# Altium footprint library pcb2D3D库101.PcbLib: 411 footprints (part 3 of 26)
Each footprint in its own frame and in the unit in brackets; x right, y up, seen from the top. Pads: shape width x height; smd on the part's side, far side on the other; paste and mask are expansions set on the pad; w line width, h text height; cw(c..) or ccw(c..) is an arc to the next point about the centre after c.
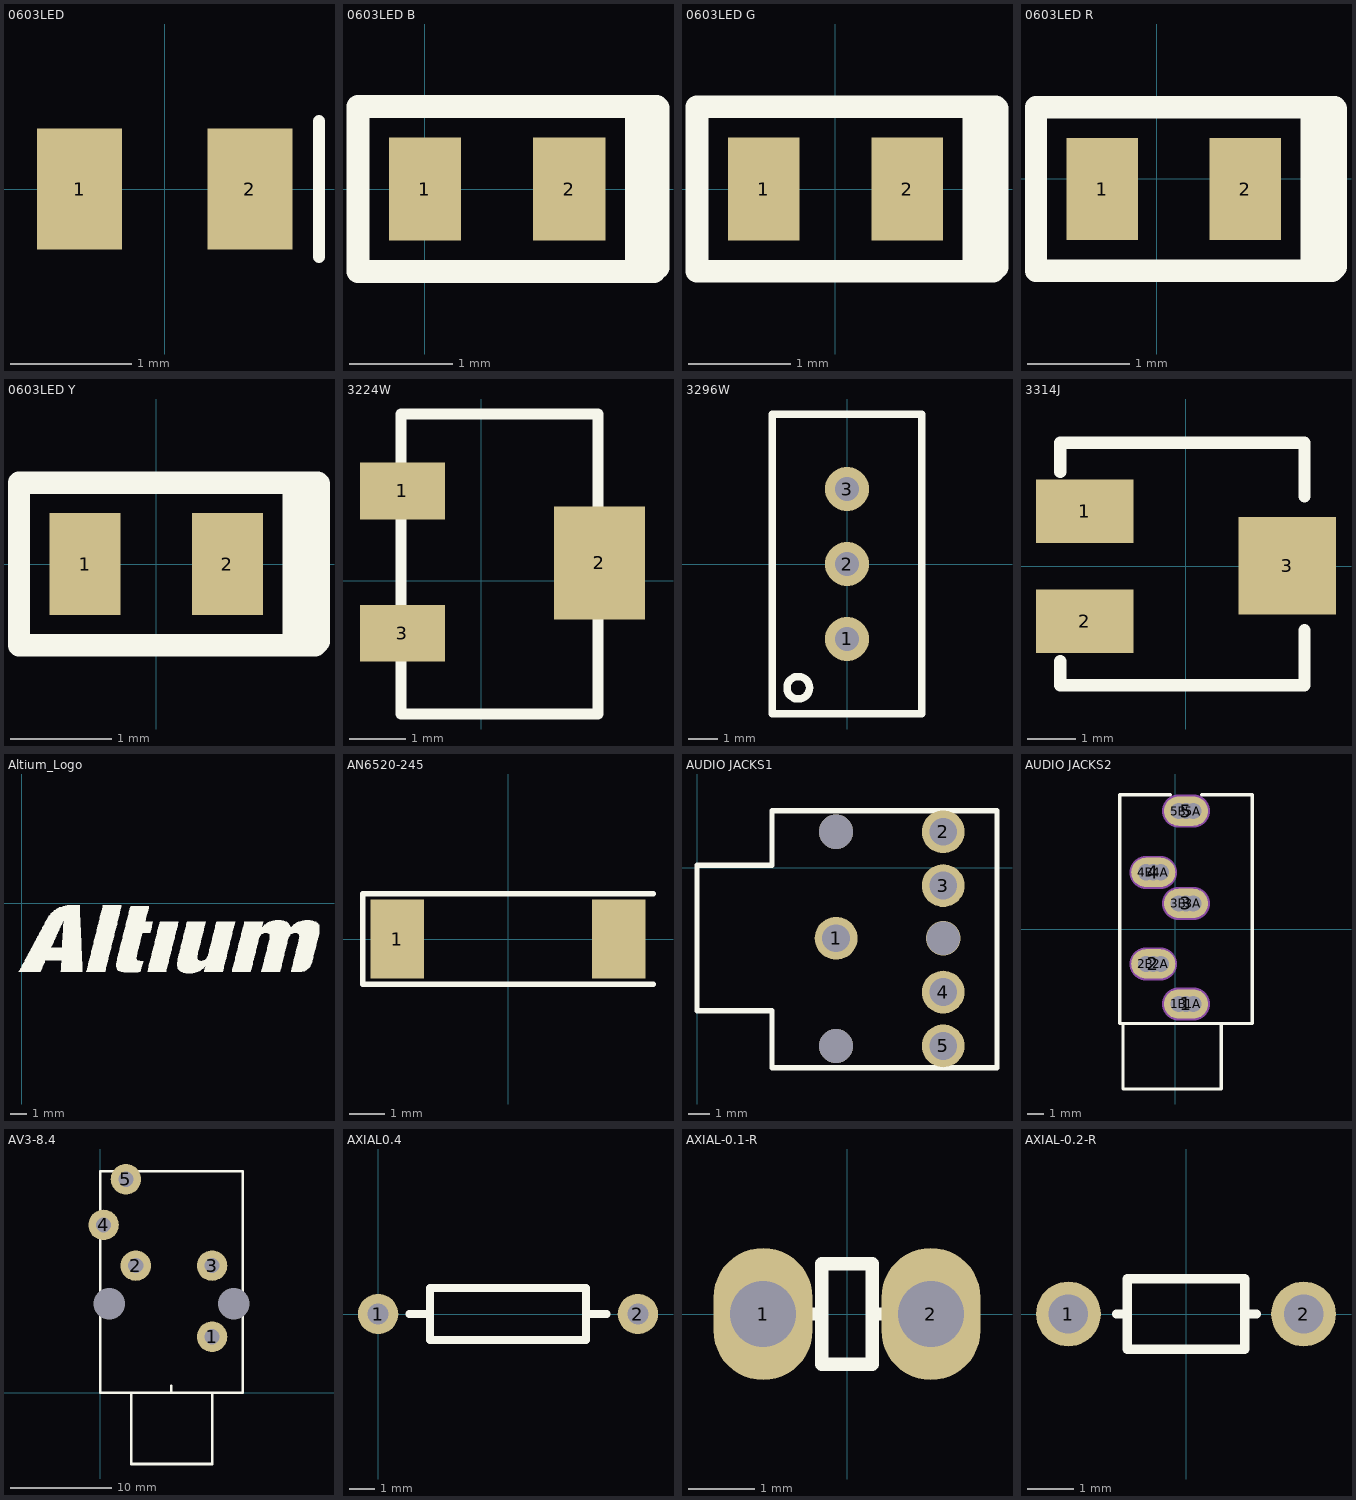
[diagram p2: the footprints below, top view; thin cyan lines are the x and y axes]

## 0603LED [mm]
pads (2):
  rect 0.7x1 smd: 1(-0.7,0) 2(0.7,0)
TopOverlay:
  lines w0.1: 1.27,-0.559 1.27,0.559
3D body "User Library-led_0603LED0603 orange.STEP": height 0.6, standoff 0, extent -0.81,-0.4 0.81,0.4

## 0603LED B [mm]
pads (2):
  rect 0.7x1 smd: 1(0,0) 2(1.4,0)
TopOverlay:
  lines w0.22: 2.248,0.8 2.05,0.8 ; 2.261,0.787 2.261,-0.762 2.223,-0.8 2.05,-0.8 ; 2.05,-0.8 -0.65,-0.8 -0.65,0.8 2.05,0.8 ; 2.05,-0.8 2.05,0.8 ; 2.083,-0.457 2.083,0.66 2.083,-0.457
3D body "User Library-led_0603LED0603 blue.STEP": height 0.6, standoff 0, extent -0.099,-0.4 1.521,0.4

## 0603LED G [mm]
pads (2):
  rect 0.7x1 smd: 1(-0.7,0) 2(0.7,0)
TopOverlay:
  lines w0.22: 1.562,0.8 1.364,0.8 1.364,-0.8 1.537,-0.8 1.575,-0.762 1.575,0.787 ; -1.35,-0.8 1.35,-0.8 1.35,0.8 -1.35,0.8 -1.35,-0.8 ; 1.397,-0.457 1.397,0.66 1.397,-0.457
3D body "User Library-led_0603LED0603 green.STEP": height 0.6, standoff 0, extent -0.81,-0.4 0.81,0.4

## 0603LED R [mm]
pads (2):
  rect 0.7x1 smd: 1(-0.533,-0.102) 2(0.867,-0.102)
TopOverlay:
  lines w0.22: 1.528,-0.902 1.528,0.698 ; 1.74,0.698 1.542,0.698 1.542,-0.902 1.715,-0.902 1.753,-0.864 1.753,0.686 ; -1.183,-0.902 -1.183,0.698 1.517,0.698 1.517,-0.902 -1.183,-0.902 ; 1.575,-0.559 1.575,0.559 1.575,-0.559
3D body "User Library-led_0603.STEP": height 0.6, standoff 0, extent -0.632,-0.501 0.988,0.299

## 0603LED Y [mm]
pads (2):
  rect 0.7x1 smd: 1(-0.7,0) 2(0.7,0)
TopOverlay:
  lines w0.22: 1.364,-0.8 1.364,0.8 ; 1.375,-0.8 1.375,0.8 ; 1.588,0.8 1.39,0.8 1.39,-0.8 1.562,-0.8 1.6,-0.762 1.6,0.787 ; -1.35,-0.8 1.35,-0.8 1.35,0.8 -1.35,0.8 -1.35,-0.8 ; 1.422,-0.457 1.422,0.66 1.422,-0.457
3D body "User Library-led_0603LED0603 orange.STEP": height 0.6, standoff 0, extent -0.81,-0.4 0.81,0.4

## 3224W [mm]
pads (3):
  rect 1.5x1 smd: 1(-1.397,1.583) 3(-1.397,-0.932)
  rect 1.6x2 smd: 2(2.083,0.313)
TopOverlay:
  lines w0.2: -1.422,-2.354 -1.422,2.942 2.057,2.942 2.057,-2.354 -1.422,-2.354
Mechanical2:
  text "+" at -0.203,0.63 h0.76
3D body "3224W.stp": height 5.29, standoff 0, extent -1.627,-2.134 2.311,2.692

## 3296W [mm]
height 2.38
pads (3):
  round 1.5 hole 0.8: 1(0,-2.54) 2(0,0) 3(0,2.54)
TopOverlay:
  circle w0.254: c-1.651,-4.191 r0.381
  lines w0.254: -2.54,-5.08 2.54,-5.08 2.54,5.08 -2.54,5.08 -2.54,-5.08
3D body "3296 pot.step": height 11.55, standoff -6.4, extent -2.413,-4.765 2.418,4.765

## 3314J [mm]
pads (3):
  rect 2x1.3 smd: 1(-2.072,1.124) 2(-2.072,-1.124)
  rect 2x2 smd: 3(2.072,0.007)
TopOverlay:
  lines w0.254: -2.578,-1.95 -2.578,-2.436 2.427,-2.436 2.427,-1.31 ; -2.578,1.93 -2.578,2.528 2.427,2.528 2.427,1.429
3D body "3314J.stp": height 2.67, standoff -0.06, extent -2.54,-2.423 2.464,2.576

## Altium_Logo [mm]
TopOverlay:
  drawing of 1243 lines, arcs and shapes, not listed

## AN6520-245 [mm]
height 1.2
pads (2):
  rect 1.5x2.2 smd: 1(-3.1,0) ""(3.1,0)
TopOverlay:
  lines w0.152: 4.064,-1.27 -4.064,-1.27 -4.064,1.27 4.064,1.27
3D body "AN6520-245.STEP": height 1.2, standoff 0, extent -3.25,-1.092 3.25,1.108

## AUDIO JACKS1 [mm]
pads (5):
  round 2 hole 1.3: 1(6.502,-3.302) 2(11.506,1.676) 3(11.506,-0.838) 4(11.506,-5.817) 5(11.506,-8.331)
via 11.506,-3.302 diameter 1.6 hole 1.56
via 6.502,-8.331 diameter 1.6 hole 1.6
via 6.502,1.676 diameter 1.6 hole 1.6
TopOverlay:
  lines w0.254: 0,-6.68 0,0.102 3.505,0.102 3.505,2.667 14.021,2.667 14.021,-9.347 3.505,-9.347 3.505,-6.68 0,-6.68
3D body "sj1-3545n(AUDIO JACKS).stp": height 11.1, standoff -3.9, extent 0.011,-9.377 15.011,2.823

## AUDIO JACKS2 [mm]
pads (15):
  oval 2.7x1.8 hole 1: 1(0.672,-4.579) 2(-1.328,-2.129) 3(0.672,1.571) 4(-1.328,3.471) 5(0.672,7.221)
  round 1.2 hole 1: 1A(1.122,-4.579) 1B(0.222,-4.579) 2A(-0.878,-2.129) 2B(-1.778,-2.129) 3A(1.122,1.571) 3B(0.222,1.571) 4A(-0.878,3.471) 4B(-1.778,3.471) 5A(1.122,7.221) 5B(0.222,7.221)
TopOverlay:
  lines w0.2: -3.178,-5.779 -3.178,-9.779 2.822,-9.779 2.822,-5.779 ; -0.278,8.221 -3.378,8.221 -3.378,-5.779 4.722,-5.779 4.722,8.221 1.622,8.221
Mechanical2:
  lines w2.016: -1.778,-2.129 -0.878,-2.129 ; -1.778,3.471 -0.878,3.471 ; 0.222,-4.579 1.122,-4.579 ; 0.222,1.571 1.122,1.571 ; 0.222,7.221 1.122,7.221
3D body "AUDIO JACK.stp": height 5.3, standoff -10.3, extent -3.478,-9.779 4.722,8.221

## AV3-8.4 [mm]
pads (7):
  round 3 hole 1.5: 1(11,5.5) 2(3.5,12.5) 3(11,12.5) 4(0.325,16.5) 5(2.525,21)
  round 3 hole 3.1 unplated: ""(0.9,8.75) ""(13.15,8.75)
TopOverlay:
  lines w0.254: 3.04,0 3.04,-7.02 11.02,-7.02 11.02,0 ; 7,0 7,0.66 ; 0,0 14,0 14,21.8 0,21.8 0,0
3D body "User Library-Mouser_161-4320.STEP": height 40.92, standoff -4.32, extent 0.3,-8.208 17.115,23.008

## AXIAL0.4 [mil] "此模型引用\"王千会\"作品，特此声明"
height 47.24
pads (2):
  round 62 hole 32: 1(0,0) 2(400,0)
TopOverlay:
  lines w12: 48,0 80,0 ; 320,0 352,0 ; 80,-40 80,40 320,40 320,-40 80,-40
3D body "SW3dPS-AXIAL_RESISTOR(0.25W).STEP": height 101.42, standoff -60, extent -12.6,-47.24 412.6,47.24

## AXIAL-0.1-R [mm] "Axial Device, Resistor , Thru-Hole; 2 Leads; 0.1 in Pin Spacing"
height 1.524
pads (2):
  oval 1.5x2 hole 1: 1(-1.27,0) 2(1.27,0)
TopOverlay:
  lines w0.2: -0.635,0 -0.406,0 ; 0.762,0 0.381,0 ; 0.381,0 0.381,0.762 -0.381,0.762 -0.381,-0.762 0.381,-0.762 0.381,0
3D body "SW3dPS-Res_Stand.STEP": height 6.85, standoff -1.9, extent -2.188,-0.952 1.524,0.889

## AXIAL-0.2-R [mm] "Axial Device, Resistor , Thru-Hole; 2 Leads; 0.3 in Pin Spacing"
height 1.524
pads (2):
  round 1.4 hole 0.85: 1(-2.54,0) 2(2.54,0)
TopOverlay:
  lines w0.2: -1.499,0 -1.27,0 ; 1.524,0 1.27,0 ; 1.27,0 1.27,-0.762 -1.27,-0.762 -1.27,0.762 1.27,0.762 1.27,0
3D body "AXIAL-0.2-0.125W.STEP": height 2.91, standoff -2, extent -2.794,-0.889 2.736,0.931